# Altium integrated library 兰格封装.IntLib: 1176 symbols (part 5 of 6) (continued)
## RES  氧化膜电阻  10R/1W
designator R?, comment 10R
10R/1W  氧化膜电阻; 物料名称: 10R 1W氧化膜电阻; 物料代码: 3.01.03.02.07.0016; 仓库名称: 元件仓; 助记码: 10R 1WYHMDZ; 单位: ֻ; 加工方式: 插件; 规格型号: *
footprint RS 1W (直插色环电阻，脚距15mm，直径4mm)
pins: 1, 2
2 alternate drawings of the same symbol

## RES  氧化膜电阻  33R/1W
designator R?, comment 33R
33R/1W 氧化膜电阻(无 ); 仓库名称: 元件仓; 单位: ֻ; 加工方式: 插件; 物料名称: *; 物料代码: *; 助记码: *; 规格型号: *
footprint RS 1W (直插色环电阻，脚距15mm，直径4mm)
pins: 1, 2
2 alternate drawings of the same symbol

## RES  氧化膜电阻  47R/1W
designator R?, comment 47R
47R/1W 氧化膜电阻(无 ); 仓库名称: 元件仓; 单位: ֻ; 加工方式: 插件; 物料名称: *; 物料代码: *; 助记码: *; 规格型号: *
footprint RS 1W (直插色环电阻，脚距15mm，直径4mm)
pins: 1, 2
2 alternate drawings of the same symbol

## RES  氧化膜电阻  68R/1W
designator R?, comment 68R
68R/1W 氧化膜电阻(无 ); 仓库名称: 元件仓; 单位: ֻ; 加工方式: 插件; 物料名称: *; 物料代码: *; 助记码: *; 规格型号: *
footprint RS 1W (直插色环电阻，脚距15mm，直径4mm)
pins: 1, 2
2 alternate drawings of the same symbol

## RES  氧化膜电阻  75R/1W
designator R?, comment 75R
75R/1W 氧化膜电阻(无 ); 仓库名称: 元件仓; 单位: ֻ; 加工方式: 插件; 物料名称: *; 物料代码: *; 助记码: *; 规格型号: *
footprint RS 1W (直插色环电阻，脚距15mm，直径4mm)
pins: 1, 2
2 alternate drawings of the same symbol

## RES  氧化膜电阻  100R/1W
designator R?, comment 100R
100R/1W 氧化膜电阻(无 ); 仓库名称: 元件仓; 单位: ֻ; 加工方式: 插件; 物料名称: *; 物料代码: *; 助记码: *; 规格型号: *
footprint RS 1W (直插色环电阻，脚距15mm，直径4mm)
pins: 1, 2
2 alternate drawings of the same symbol

## RES  氧化膜电阻  150R/1W
designator R?, comment 150R
150R/1W 氧化膜电阻; 物料名称: 150R 1W 氧化膜电阻; 物料代码: 3.01.03.02.07.0001; 仓库名称: 元件仓; 助记码: 150R 1W YHDZ; 单位: ֻ; 加工方式: 插件; 规格型号: *
footprint RS 1W (直插色环电阻，脚距15mm，直径4mm)
pins: 1, 2
2 alternate drawings of the same symbol

## RES  氧化膜电阻  220R/1W
designator R?, comment 220R
220R/1W 氧化膜电阻; 物料名称: 220R 1W 氧化膜电阻; 物料代码: 3.01.03.02.07.0004; 仓库名称: 元件仓; 助记码: 220R 1W YHDZ; 单位: ֻ; 加工方式: 插件; 规格型号: *
footprint RS 1W (直插色环电阻，脚距15mm，直径4mm)
pins: 1, 2
2 alternate drawings of the same symbol

## RES  氧化膜电阻  330R/1W
designator R?, comment 330R
330R/1W 氧化膜电阻(无 ); 仓库名称: 元件仓; 单位: ֻ; 加工方式: 插件; 物料名称: *; 物料代码: *; 助记码: *; 规格型号: *
footprint RS 1W (直插色环电阻，脚距15mm，直径4mm)
pins: 1, 2
2 alternate drawings of the same symbol

## RES  氧化膜电阻  470R/1W
designator R?, comment 470R
470R/1W 氧化膜电阻(无 ); 仓库名称: 元件仓; 单位: ֻ; 加工方式: 插件; 物料名称: *; 物料代码: *; 助记码: *; 规格型号: *
footprint RS 1W (直插色环电阻，脚距15mm，直径4mm)
pins: 1, 2
2 alternate drawings of the same symbol

## RES  氧化膜电阻  560R/1W
designator R?, comment 560R
560R/1W 氧化膜电阻(无 ); 仓库名称: 元件仓; 单位: ֻ; 加工方式: 插件; 物料名称: *; 物料代码: *; 助记码: *; 规格型号: *
footprint RS 1W (直插色环电阻，脚距15mm，直径4mm)
pins: 1, 2
2 alternate drawings of the same symbol

## RES  氧化膜电阻  680R/1W
designator R?, comment 680R
680R/1W 氧化膜电阻(无 ); 仓库名称: 元件仓; 单位: ֻ; 加工方式: 插件; 物料名称: *; 物料代码: *; 助记码: *; 规格型号: *
footprint RS 1W (直插色环电阻，脚距15mm，直径4mm)
pins: 1, 2
2 alternate drawings of the same symbol

## RES  氧化膜电阻   750R/1W
designator R?, comment 750R
750R/1W 氧化膜电阻(无 ); 仓库名称: 元件仓; 单位: ֻ; 加工方式: 插件; 物料名称: *; 物料代码: *; 助记码: *; 规格型号: *
footprint RS 1W (直插色环电阻，脚距15mm，直径4mm)
pins: 1, 2
2 alternate drawings of the same symbol

## RES  水泥电阻  10R/5W  卧式
designator R?, comment 10RJ/5W
10R/5W  卧式  水泥电阻; 物料代码: 3.01.03.02.02.0003; 仓库名称: 元件仓; 助记码: 10R/5W  WS  SNDZ; 单位: ֻ; 加工方式: 插件; 物料名称: 10R/5W  卧式  水泥电阻; 规格型号: *
footprint 水泥电阻卧式  5W10RJ
pins: 1, 2
2 alternate drawings of the same symbol

## RES  热敏电阻  10K
designator R?, comment 10K
10K 热敏电阻; 物料代码: 3.01.03.02.04.0001; 仓库名称: 元件仓; 单位: ֻ; 加工方式: 插件; 物料名称: 10K 热敏电阻; 规格型号: *
footprint NTC  10D-20 (热敏电阻)
pins: 1, 2
2 alternate drawings of the same symbol

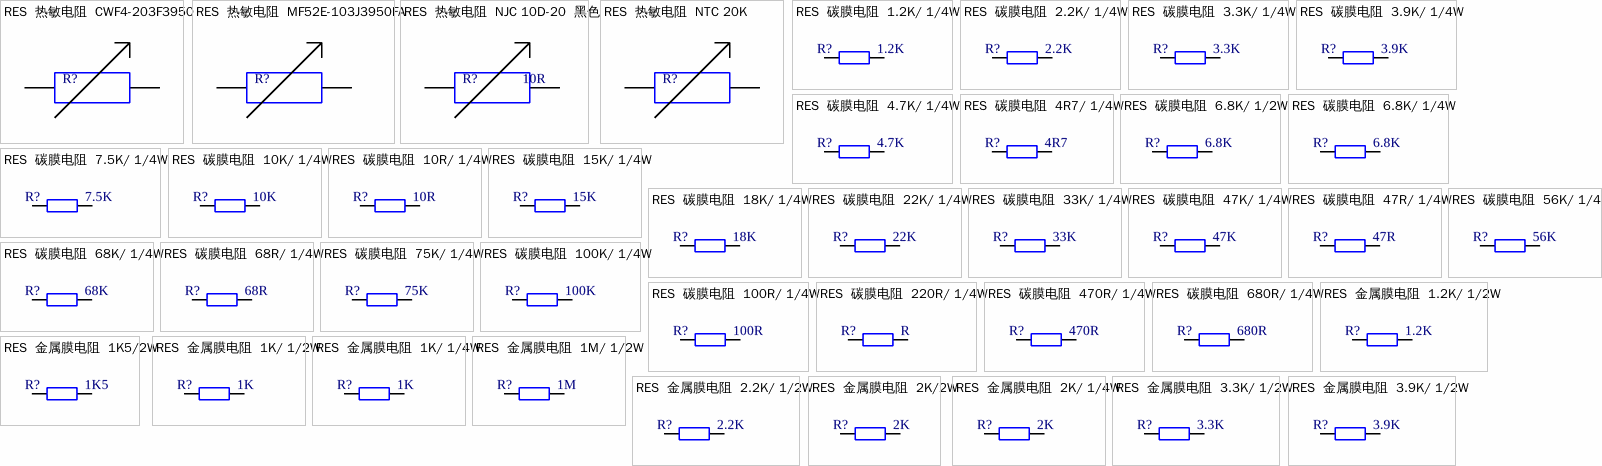
[diagram p43: symbols RES  热敏电阻  CWF4-203F3950 to RES  金属膜电阻  3.9K/ 1/2W]

## RES  热敏电阻  CWF4-203F3950
designator R?
CWF4-203F3950  U型热敏电阻; 物料代码: 3.01.03.02.04.0007; 仓库名称: 元件仓; 助记码: CWF4-203F3950  UXRMD; 单位: ֻ; 加工方式: 插件; 物料名称: CWF4-203F3950  U型热敏电阻; 规格型号: *
footprint NTC  10D-20 (热敏电阻)
pins: 1, 2
2 alternate drawings of the same symbol

## RES  热敏电阻  MF52E-103J3950FA
designator R?
MF52E-103J3950FA 热敏电阻; 物料代码: 3.01.03.02.04.0006; 仓库名称: 元件仓; 助记码: MF52E-103J3950FA RMD; 单位: ֻ; 加工方式: 插件; 物料名称: MF52E-103J3950FA 热敏电阻; 规格型号: *
footprint NTC  10D-20 (热敏电阻)
pins: 1, 2
2 alternate drawings of the same symbol

## RES  热敏电阻  NJC 10D-20  黑色
designator R?, comment 10R
NJC 10D-20黑色热敏电阻; 物料代码: 3.01.03.02.04.0004; 仓库名称: 元件仓; 助记码: NJC 10D-20HSRMDZ; 单位: ֻ; 加工方式: 插件; 物料名称: NJC 10D-20黑色热敏电阻; 规格型号: *
footprint NTC  10D-20 (热敏电阻)
pins: 1, 2
2 alternate drawings of the same symbol

## RES  热敏电阻  NTC 20K
designator R?
NTC 20K 热敏电阻; 物料代码: 3.01.03.02.04.0005; 仓库名称: 元件仓; 助记码: NTC 20K RMDZ; 单位: ֻ; 加工方式: 插件; 物料名称: NTC 20K 热敏电阻; 规格型号: *
footprint NTC  10D-20 (热敏电阻)
pins: 1, 2
2 alternate drawings of the same symbol

## RES  碳膜电阻  1.2K/ 1/4W
designator R?, comment 1.2K
1.2K/ 1/4W 碳膜电阻; 物料名称: 1.2K 1/4W 碳膜电阻; 物料代码: 3.01.03.02.01.0027; 仓库名称: 元件仓; 助记码: 1.2K 1/4W TMDZ; 单位: ֻ; 加工方式: 插件; 规格型号: *
footprint RS 1/4W (直插色环电阻，脚距9mm，直径2.3mm)
pins: 1, 2
2 alternate drawings of the same symbol

## RES  碳膜电阻  2.2K/ 1/4W
designator R?, comment 2.2K
2.2K/ 1/4W 碳膜电阻; 物料名称: 2.2K 1/4W 碳膜电阻; 物料代码: 3.01.03.02.01.0024; 仓库名称: 元件仓; 助记码: 2.2K 1/4W TMDZ; 单位: ֻ; 加工方式: 插件; 规格型号: *
footprint RS 1/4W (直插色环电阻，脚距9mm，直径2.3mm)
pins: 1, 2
2 alternate drawings of the same symbol

## RES  碳膜电阻  3.3K/ 1/4W
designator R?, comment 3.3K
3.3K/ 1/4W 碳膜电阻  （无）; 仓库名称: 元件仓; 单位: ֻ; 加工方式: 插件; 物料名称: *; 物料代码: *; 助记码: *; 规格型号: *
footprint RS 1/4W (直插色环电阻，脚距9mm，直径2.3mm)
pins: 1, 2
2 alternate drawings of the same symbol

## RES  碳膜电阻  3.9K/ 1/4W
designator R?, comment 3.9K
3.9K/ 1/4W 碳膜电阻  （无）; 仓库名称: 元件仓; 单位: ֻ; 加工方式: 插件; 物料名称: *; 物料代码: *; 助记码: *; 规格型号: *
footprint RS 1/4W (直插色环电阻，脚距9mm，直径2.3mm)
pins: 1, 2
2 alternate drawings of the same symbol

## RES  碳膜电阻  4.7K/ 1/4W
designator R?, comment 4.7K
4.7K/ 1/4W 碳膜电阻; 物料名称: 4.7K 1/4W 碳膜电阻; 物料代码: 3.01.03.02.01.0025; 仓库名称: 元件仓; 助记码: 4.7K 1/4W TMDZ; 单位: ֻ; 加工方式: 插件; 规格型号: *
footprint RS 1/4W (直插色环电阻，脚距9mm，直径2.3mm)
pins: 1, 2
2 alternate drawings of the same symbol

## RES  碳膜电阻  4R7/ 1/4W
designator R?, comment 4R7
4R7/ 1/4W  碳膜电阻; 物料名称: 4R7 1/4W碳膜电阻; 物料代码: 3.01.03.02.01.0046; 仓库名称: 元件仓; 助记码: 4R7 1/4WTMDZ; 单位: ֻ; 加工方式: 插件; 规格型号: *
footprint RS 1/4W (直插色环电阻，脚距9mm，直径2.3mm)
pins: 1, 2
2 alternate drawings of the same symbol

## RES  碳膜电阻  6.8K/ 1/2W
designator R?, comment 6.8K
6.8K/ 1/2W 碳膜电阻; 物料名称: 6.8K 1/2W 碳膜电阻; 物料代码: 3.01.03.02.01.0015; 仓库名称: 元件仓; 助记码: 6.8K 1/2 TMDZ; 单位: ֻ; 加工方式: 插件; 规格型号: *
footprint RS 1/2W (直插色环电阻，脚距12.5mm，直径3mm)
pins: 1, 2
2 alternate drawings of the same symbol

## RES  碳膜电阻  6.8K/ 1/4W
designator R?, comment 6.8K
6.8K/ 1/4W 碳膜电阻（无）; 仓库名称: 元件仓; 单位: ֻ; 加工方式: 插件; 规格型号: *
footprint RS 1/2W (直插色环电阻，脚距12.5mm，直径3mm)
pins: 1, 2
2 alternate drawings of the same symbol

## RES  碳膜电阻  7.5K/ 1/4W
designator R?, comment 7.5K
7.5K/ 1/4W 碳膜电阻  （无）; 仓库名称: 元件仓; 单位: ֻ; 加工方式: 插件; 物料名称: *; 物料代码: *; 助记码: *; 规格型号: *
footprint RS 1/4W (直插色环电阻，脚距9mm，直径2.3mm)
pins: 1, 2
2 alternate drawings of the same symbol

## RES  碳膜电阻  10K/ 1/4W
designator R?, comment 10K
10K/ 1/4W 碳膜电阻; 物料名称: 10K 1/4W 碳膜电阻; 物料代码: 3.01.03.02.01.0029; 仓库名称: 元件仓; 助记码: 10K 1/4W TMDZ; 单位: ֻ; 加工方式: 插件; 规格型号: *
footprint RS 1/4W (直插色环电阻，脚距9mm，直径2.3mm)
pins: 1, 2
2 alternate drawings of the same symbol

## RES  碳膜电阻  10R/ 1/4W
designator R?, comment 10R
10R/ 1/4W 碳膜电阻; 物料名称: 10R 1/4W 碳膜电阻; 物料代码: 3.01.03.02.01.0020; 仓库名称: 元件仓; 助记码: 10R 1/4W TMDZ; 单位: ֻ; 加工方式: 插件; 规格型号: *
footprint RS 1/4W (直插色环电阻，脚距9mm，直径2.3mm)
pins: 1, 2
2 alternate drawings of the same symbol

## RES  碳膜电阻  15K/ 1/4W
designator R?, comment 15K
15K/ 1/4W 碳膜电阻; 物料名称: 15K 1/4W 碳膜电阻; 物料代码: 3.01.03.02.01.0028; 仓库名称: 元件仓; 助记码: 15K 1/4W TMDZ; 单位: ֻ; 加工方式: 插件; 规格型号: *
footprint RS 1/4W (直插色环电阻，脚距9mm，直径2.3mm)
pins: 1, 2
2 alternate drawings of the same symbol

## RES  碳膜电阻  18K/ 1/4W
designator R?, comment 18K
18K/ 1/4W 碳膜电阻  (无 ); 仓库名称: 元件仓; 单位: ֻ; 加工方式: 插件; 物料名称: *; 物料代码: *; 助记码: *; 规格型号: *
footprint RS 1/4W (直插色环电阻，脚距9mm，直径2.3mm)
pins: 1, 2
2 alternate drawings of the same symbol

## RES  碳膜电阻  22K/ 1/4W
designator R?, comment 22K
22K/ 1/4W 碳膜电阻; 物料名称: 22K 1/4W 碳膜电阻; 物料代码: 3.01.03.02.01.0030; 仓库名称: 元件仓; 助记码: 22K 1/4W TMDZ; 单位: ֻ; 加工方式: 插件; 规格型号: *
footprint RS 1/4W (直插色环电阻，脚距9mm，直径2.3mm)
pins: 1, 2
2 alternate drawings of the same symbol

## RES  碳膜电阻  33K/ 1/4W
designator R?, comment 33K
33K/ 1/4W 碳膜电阻; 物料名称: 33K 1/4W 碳膜电阻; 物料代码: 3.01.03.02.01.0031; 仓库名称: 元件仓; 助记码: 33K 1/4W TMDZ; 单位: ֻ; 加工方式: 插件; 规格型号: *
footprint RS 1/4W (直插色环电阻，脚距9mm，直径2.3mm)
pins: 1, 2
2 alternate drawings of the same symbol

## RES  碳膜电阻  47K/ 1/4W
designator R?, comment 47K
47K/ 1/4W 碳膜电阻; 物料名称: 47K 1/4W 碳膜电阻; 物料代码: 3.01.03.02.01.0032; 仓库名称: 元件仓; 助记码: 47K 1/4W TMDZ; 单位: ֻ; 加工方式: 插件; 规格型号: *
footprint RS 1/4W (直插色环电阻，脚距9mm，直径2.3mm)
pins: 1, 2
2 alternate drawings of the same symbol

## RES  碳膜电阻  47R/ 1/4W
designator R?, comment 47R
47R/ 1/4W 碳膜电阻（无）; 仓库名称: 元件仓; 加工方式: 插件; 物料名称: *; 物料代码: *; 助记码: *; 单位: *; 备注: *; 规格型号: *
footprint RS 1/4W (直插色环电阻，脚距9mm，直径2.3mm)
pins: 1, 2
2 alternate drawings of the same symbol

## RES  碳膜电阻  56K/ 1/4W
designator R?, comment 56K
56K/ 1/4W 碳膜电阻  (无 ); 仓库名称: 元件仓; 单位: ֻ; 加工方式: 插件; 物料名称: *; 物料代码: *; 助记码: *; 规格型号: *
footprint RS 1/4W (直插色环电阻，脚距9mm，直径2.3mm)
pins: 1, 2
2 alternate drawings of the same symbol

## RES  碳膜电阻  68K/ 1/4W
designator R?, comment 68K
68K/ 1/4W 碳膜电阻  (无 ); 仓库名称: 元件仓; 单位: ֻ; 加工方式: 插件; 物料名称: *; 物料代码: *; 助记码: *; 规格型号: *
footprint RS 1/4W (直插色环电阻，脚距9mm，直径2.3mm)
pins: 1, 2
2 alternate drawings of the same symbol

## RES  碳膜电阻  68R/ 1/4W
designator R?, comment 68R
68R/ 1/4W 碳膜电阻（无）; 仓库名称: 元件仓; 加工方式: 插件; 物料名称: *; 物料代码: *; 助记码: *; 单位: *; 备注: *; 规格型号: *
footprint RS 1/4W (直插色环电阻，脚距9mm，直径2.3mm)
pins: 1, 2
2 alternate drawings of the same symbol

## RES  碳膜电阻  75K/ 1/4W
designator R?, comment 75K
75K/ 1/4W 碳膜电阻  (无 ); 仓库名称: 元件仓; 单位: ֻ; 加工方式: 插件; 物料名称: *; 物料代码: *; 助记码: *; 规格型号: *
footprint RS 1/4W (直插色环电阻，脚距9mm，直径2.3mm)
pins: 1, 2
2 alternate drawings of the same symbol

## RES  碳膜电阻  100K/ 1/4W
designator R?, comment 100K
100K/ 1/4W 碳膜电阻  (无 ); 仓库名称: 元件仓; 单位: ֻ; 加工方式: 插件; 物料名称: *; 物料代码: *; 助记码: *; 规格型号: *
footprint RS 1/4W (直插色环电阻，脚距9mm，直径2.3mm)
pins: 1, 2
2 alternate drawings of the same symbol

## RES  碳膜电阻  100R/ 1/4W
designator R?, comment 100R
100R/ 1/4W 碳膜电阻（无）; 仓库名称: 元件仓; 加工方式: 插件; 物料名称: *; 物料代码: *; 助记码: *; 单位: *; 备注: *; 规格型号: *
footprint RS 1/4W (直插色环电阻，脚距9mm，直径2.3mm)
pins: 1, 2
2 alternate drawings of the same symbol

## RES  碳膜电阻  220R/ 1/4W
designator R?, comment R
220R/ 1/4W 碳膜电阻; 物料名称: 220R  1/4W 碳膜电阻; 物料代码: 3.01.03.02.01.0018; 仓库名称: 元件仓; 助记码: 220R  1/4W TMDZ; 单位: ֻ; 加工方式: 插件; 规格型号: *
footprint RS 1/4W (直插色环电阻，脚距9mm，直径2.3mm)
pins: 1, 2
2 alternate drawings of the same symbol

## RES  碳膜电阻  470R/ 1/4W
designator R?, comment 470R
470R/ 1/4W 碳膜电阻; 物料名称: 470R 1/4W 碳膜电阻; 物料代码: 3.01.03.02.01.0021; 仓库名称: 元件仓; 助记码: 470R 1/4W TMDZ; 单位: ֻ; 加工方式: 插件; 规格型号: *
footprint RS 1/4W (直插色环电阻，脚距9mm，直径2.3mm)
pins: 1, 2
2 alternate drawings of the same symbol

## RES  碳膜电阻  680R/ 1/4W
designator R?, comment 680R
680R/ 1/4W 碳膜电阻; 物料名称: 680R 1/4W碳膜电阻; 物料代码: 3.01.03.02.01.0044; 仓库名称: 元件仓; 助记码: 680R 1/4WTMDZ; 单位: ֻ; 加工方式: 插件; 规格型号: *
footprint RS 1/4W (直插色环电阻，脚距9mm，直径2.3mm)
pins: 1, 2
2 alternate drawings of the same symbol

## RES  金属膜电阻  1.2K/ 1/2W
designator R?, comment 1.2K
1.2K/ 1/2W 金属膜电阻  (无 ); 仓库名称: 元件仓; 单位: ֻ; 加工方式: 插件; 物料名称: *; 物料代码: *; 助记码: *; 规格型号: *
footprint RS 1/2W (直插色环电阻，脚距12.5mm，直径3mm)
pins: 1, 2
2 alternate drawings of the same symbol

## RES  金属膜电阻  1K5/2W
designator R?, comment 1K5
1K5/2W 金属膜电阻  (无 ); 仓库名称: 元件仓; 单位: ֻ; 加工方式: 插件; 物料名称: *; 物料代码: *; 助记码: *; 规格型号: *
footprint RS 2W (直插色环电阻，脚距20mm，直径5mm)
pins: 1, 2
2 alternate drawings of the same symbol

## RES  金属膜电阻  1K/ 1/2W
designator R?, comment 1K
1K/ 1/2W 金属膜电阻  (无 ); 仓库名称: 元件仓; 单位: ֻ; 加工方式: 插件; 物料名称: *; 物料代码: *; 助记码: *; 规格型号: *
footprint RS 1/2W (直插色环电阻，脚距12.5mm，直径3mm)
pins: 1, 2
2 alternate drawings of the same symbol

## RES  金属膜电阻  1K/ 1/4W
designator R?, comment 1K
1K/ 1/4W 金属膜电阻  (无 ); 仓库名称: 元件仓; 单位: ֻ; 加工方式: 插件; 物料名称: *; 物料代码: *; 助记码: *; 规格型号: *
footprint RS 1/4W (直插色环电阻，脚距9mm，直径2.3mm)
pins: 1, 2
2 alternate drawings of the same symbol

## RES  金属膜电阻  1M/ 1/2W
designator R?, comment 1M
1M/ 1/2W 金属膜电阻  (无 ); 仓库名称: 元件仓; 单位: ֻ; 加工方式: 插件; 物料名称: *; 物料代码: *; 助记码: *; 规格型号: *
footprint RS 1/2W (直插色环电阻，脚距12.5mm，直径3mm)
pins: 1, 2
2 alternate drawings of the same symbol

## RES  金属膜电阻  2.2K/ 1/2W
designator R?, comment 2.2K
2.2K/ 1/2W 金属膜电阻  (无 ); 仓库名称: 元件仓; 单位: ֻ; 加工方式: 插件; 物料名称: *; 物料代码: *; 助记码: *; 规格型号: *
footprint RS 1/2W (直插色环电阻，脚距12.5mm，直径3mm)
pins: 1, 2
2 alternate drawings of the same symbol

## RES  金属膜电阻  2K/2W
designator R?, comment 2K
2K/2W 金属膜电阻  (无 ); 仓库名称: 元件仓; 单位: ֻ; 加工方式: 插件; 物料名称: *; 物料代码: *; 助记码: *; 规格型号: *
footprint RS 2W (直插色环电阻，脚距20mm，直径5mm)
pins: 1, 2
2 alternate drawings of the same symbol

## RES  金属膜电阻  2K/ 1/4W
designator R?, comment 2K
2K/ 1/4W 金属膜电阻  (无 ); 仓库名称: 元件仓; 单位: ֻ; 加工方式: 插件; 物料名称: *; 物料代码: *; 助记码: *; 规格型号: *
footprint RS 1/4W (直插色环电阻，脚距9mm，直径2.3mm)
pins: 1, 2
2 alternate drawings of the same symbol

## RES  金属膜电阻  3.3K/ 1/2W
designator R?, comment 3.3K
3.3K/ 1/2W 金属膜电阻  (无 ); 仓库名称: 元件仓; 单位: ֻ; 加工方式: 插件; 物料名称: *; 物料代码: *; 助记码: *; 规格型号: *
footprint RS 1/2W (直插色环电阻，脚距12.5mm，直径3mm)
pins: 1, 2
2 alternate drawings of the same symbol

## RES  金属膜电阻  3.9K/ 1/2W
designator R?, comment 3.9K
3.9K/ 1/2W 金属膜电阻  (无 ); 仓库名称: 元件仓; 单位: ֻ; 加工方式: 插件; 物料名称: *; 物料代码: *; 助记码: *; 规格型号: *
footprint RS 1/2W (直插色环电阻，脚距12.5mm，直径3mm)
pins: 1, 2
2 alternate drawings of the same symbol

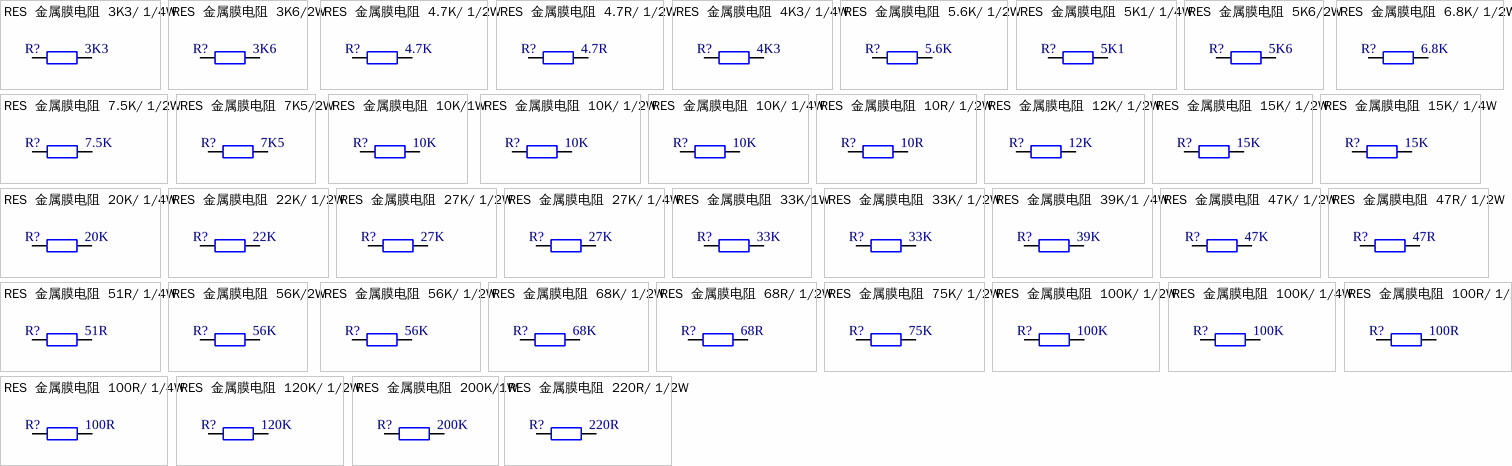
[diagram p44: symbols RES  金属膜电阻  3K3/ 1/4W to RES  金属膜电阻  220R/ 1/2W]

## RES  金属膜电阻  3K3/ 1/4W
designator R?, comment 3K3
3K3/ 1/4W 金属膜电阻  (无 ); 仓库名称: 元件仓; 单位: ֻ; 加工方式: 插件; 物料名称: *; 物料代码: *; 助记码: *; 规格型号: *
footprint RS 1/4W (直插色环电阻，脚距9mm，直径2.3mm)
pins: 1, 2
2 alternate drawings of the same symbol

## RES  金属膜电阻  3K6/2W
designator R?, comment 3K6
3K6/2W 金属膜电阻  (无 ); 仓库名称: 元件仓; 单位: ֻ; 加工方式: 插件; 物料名称: *; 物料代码: *; 助记码: *; 规格型号: *
footprint RS 2W (直插色环电阻，脚距20mm，直径5mm)
pins: 1, 2
2 alternate drawings of the same symbol

## RES  金属膜电阻  4.7K/ 1/2W
designator R?, comment 4.7K
4.7K/ 1/2W 金属膜电阻  (无 ); 仓库名称: 元件仓; 单位: ֻ; 加工方式: 插件; 物料名称: *; 物料代码: *; 助记码: *; 规格型号: *
footprint RS 1/2W (直插色环电阻，脚距12.5mm，直径3mm)
pins: 1, 2
2 alternate drawings of the same symbol

## RES  金属膜电阻  4.7R/ 1/2W
designator R?, comment 4.7R
4.7R/ 1/2W 金属膜电阻  (无 ); 仓库名称: 元件仓; 单位: ֻ; 加工方式: 插件; 物料名称: *; 物料代码: *; 助记码: *; 规格型号: *
footprint RS 1/2W (直插色环电阻，脚距12.5mm，直径3mm)
pins: 1, 2
2 alternate drawings of the same symbol

## RES  金属膜电阻  4K3/ 1/4W
designator R?, comment 4K3
4K3/ 1/4W 金属膜电阻  (无 ); 仓库名称: 元件仓; 单位: ֻ; 加工方式: 插件; 物料名称: *; 物料代码: *; 助记码: *; 规格型号: *
footprint RS 1/4W (直插色环电阻，脚距9mm，直径2.3mm)
pins: 1, 2
2 alternate drawings of the same symbol

## RES  金属膜电阻  5.6K/ 1/2W
designator R?, comment 5.6K
5.6K/ 1/2W 金属膜电阻  (无 ); 仓库名称: 元件仓; 单位: ֻ; 加工方式: 插件; 物料名称: *; 物料代码: *; 助记码: *; 规格型号: *
footprint RS 1/2W (直插色环电阻，脚距12.5mm，直径3mm)
pins: 1, 2
2 alternate drawings of the same symbol

## RES  金属膜电阻  5K1/ 1/4W
designator R?, comment 5K1
5K1/ 1/4W 金属膜电阻  (无 ); 仓库名称: 元件仓; 单位: ֻ; 加工方式: 插件; 物料名称: *; 物料代码: *; 助记码: *; 规格型号: *
footprint RS 1/4W (直插色环电阻，脚距9mm，直径2.3mm)
pins: 1, 2
2 alternate drawings of the same symbol

## RES  金属膜电阻  5K6/2W
designator R?, comment 5K6
5K6/2W 金属膜电阻  (无 ); 仓库名称: 元件仓; 单位: ֻ; 加工方式: 插件; 物料名称: *; 物料代码: *; 助记码: *; 规格型号: *
footprint RS 2W (直插色环电阻，脚距20mm，直径5mm)
pins: 1, 2
2 alternate drawings of the same symbol

## RES  金属膜电阻  6.8K/ 1/2W
designator R?, comment 6.8K
6.8K/ 1/2W 金属膜电阻  (无 ); 仓库名称: 元件仓; 单位: ֻ; 加工方式: 插件; 物料名称: *; 物料代码: *; 助记码: *; 规格型号: *
footprint RS 1/2W (直插色环电阻，脚距12.5mm，直径3mm)
pins: 1, 2
2 alternate drawings of the same symbol

## RES  金属膜电阻  7.5K/ 1/2W
designator R?, comment 7.5K
7.5K/ 1/2W 金属膜电阻  (无 ); 仓库名称: 元件仓; 单位: ֻ; 加工方式: 插件; 物料名称: *; 物料代码: *; 助记码: *; 规格型号: *
footprint RS 1/2W (直插色环电阻，脚距12.5mm，直径3mm)
pins: 1, 2
2 alternate drawings of the same symbol

## RES  金属膜电阻  7K5/2W
designator R?, comment 7K5
7K5/2W 金属膜电阻  (无 ); 仓库名称: 元件仓; 单位: ֻ; 加工方式: 插件; 物料名称: *; 物料代码: *; 助记码: *; 规格型号: *
footprint RS 2W (直插色环电阻，脚距20mm，直径5mm)
pins: 1, 2
2 alternate drawings of the same symbol

## RES  金属膜电阻  10K/1W
designator R?, comment 10K
10K/1W 金属膜电阻  (无 ); 仓库名称: 元件仓; 单位: ֻ; 加工方式: 插件; 物料名称: *; 物料代码: *; 助记码: *; 规格型号: *
footprint RS 1W (直插色环电阻，脚距15mm，直径4mm)
pins: 1, 2
2 alternate drawings of the same symbol

## RES  金属膜电阻  10K/ 1/2W
designator R?, comment 10K
10K/ 1/2W 金属膜电阻  (无 ); 仓库名称: 元件仓; 单位: ֻ; 加工方式: 插件; 物料名称: *; 物料代码: *; 助记码: *; 规格型号: *
footprint RS 1/2W (直插色环电阻，脚距12.5mm，直径3mm)
pins: 1, 2
2 alternate drawings of the same symbol

## RES  金属膜电阻  10K/ 1/4W
designator R?, comment 10K
10K/ 1/4W 金属膜电阻  (无 ); 仓库名称: 元件仓; 单位: ֻ; 加工方式: 插件; 物料名称: *; 物料代码: *; 助记码: *; 规格型号: *
footprint RS 1/4W (直插色环电阻，脚距9mm，直径2.3mm)
pins: 1, 2
2 alternate drawings of the same symbol

## RES  金属膜电阻  10R/ 1/2W
designator R?, comment 10R
10R/ 1/2W 金属膜电阻  (无 ); 仓库名称: 元件仓; 单位: ֻ; 加工方式: 插件; 物料名称: *; 物料代码: *; 助记码: *; 规格型号: *
footprint RS 1/2W (直插色环电阻，脚距12.5mm，直径3mm)
pins: 1, 2
2 alternate drawings of the same symbol

## RES  金属膜电阻  12K/ 1/2W
designator R?, comment 12K
12K/ 1/2W 金属膜电阻  (无 ); 仓库名称: 元件仓; 单位: ֻ; 加工方式: 插件; 物料名称: *; 物料代码: *; 助记码: *; 规格型号: *
footprint RS 1/2W (直插色环电阻，脚距12.5mm，直径3mm)
pins: 1, 2
2 alternate drawings of the same symbol

## RES  金属膜电阻  15K/ 1/2W
designator R?, comment 15K
15K/ 1/2W 金属膜电阻  (无 ); 仓库名称: 元件仓; 单位: ֻ; 加工方式: 插件; 物料名称: *; 物料代码: *; 助记码: *; 规格型号: *
footprint RS 1/2W (直插色环电阻，脚距12.5mm，直径3mm)
pins: 1, 2
2 alternate drawings of the same symbol

## RES  金属膜电阻  15K/ 1/4W
designator R?, comment 15K
15K/ 1/4W 金属膜电阻  (无 ); 仓库名称: 元件仓; 单位: ֻ; 加工方式: 插件; 物料名称: *; 物料代码: *; 助记码: *; 规格型号: *
footprint RS 1/4W (直插色环电阻，脚距9mm，直径2.3mm)
pins: 1, 2
2 alternate drawings of the same symbol

## RES  金属膜电阻  20K/ 1/4W
designator R?, comment 20K
20K/ 1/4W 金属膜电阻  (无 ); 仓库名称: 元件仓; 单位: ֻ; 加工方式: 插件; 物料名称: *; 物料代码: *; 助记码: *; 规格型号: *
footprint RS 1/4W (直插色环电阻，脚距9mm，直径2.3mm)
pins: 1, 2
2 alternate drawings of the same symbol

## RES  金属膜电阻  22K/ 1/2W
designator R?, comment 22K
22K/ 1/2W 金属膜电阻  (无 ); 仓库名称: 元件仓; 单位: ֻ; 加工方式: 插件; 物料名称: *; 物料代码: *; 助记码: *; 规格型号: *
footprint RS 1/2W (直插色环电阻，脚距12.5mm，直径3mm)
pins: 1, 2
2 alternate drawings of the same symbol

## RES  金属膜电阻  27K/ 1/2W
designator R?, comment 27K
27K/ 1/2W 金属膜电阻  (无 ); 仓库名称: 元件仓; 单位: ֻ; 加工方式: 插件; 物料名称: *; 物料代码: *; 助记码: *; 规格型号: *
footprint RS 1/2W (直插色环电阻，脚距12.5mm，直径3mm)
pins: 1, 2
2 alternate drawings of the same symbol

## RES  金属膜电阻  27K/ 1/4W
designator R?, comment 27K
27K/ 1/4W 金属膜电阻  (无 ); 仓库名称: 元件仓; 单位: ֻ; 加工方式: 插件; 物料名称: *; 物料代码: *; 助记码: *; 规格型号: *
footprint RS 1/4W (直插色环电阻，脚距9mm，直径2.3mm)
pins: 1, 2
2 alternate drawings of the same symbol

## RES  金属膜电阻  33K/1W
designator R?, comment 33K
33K/1W 金属膜电阻  (无 ); 仓库名称: 元件仓; 单位: ֻ; 加工方式: 插件; 物料名称: *; 物料代码: *; 助记码: *; 规格型号: *
footprint RS 1W (直插色环电阻，脚距15mm，直径4mm)
pins: 1, 2
2 alternate drawings of the same symbol

## RES  金属膜电阻  33K/ 1/2W
designator R?, comment 33K
33K/ 1/2W 金属膜电阻  (无 ); 仓库名称: 元件仓; 单位: ֻ; 加工方式: 插件; 物料名称: *; 物料代码: *; 助记码: *; 规格型号: *
footprint RS 1/2W (直插色环电阻，脚距12.5mm，直径3mm)
pins: 1, 2
2 alternate drawings of the same symbol

## RES  金属膜电阻  39K/1 /4W
designator R?, comment 39K
39K/1 /4W 金属膜电阻  (无 ); 仓库名称: 元件仓; 单位: ֻ; 加工方式: 插件; 物料名称: *; 物料代码: *; 助记码: *; 规格型号: *
footprint RS 1/4W (直插色环电阻，脚距9mm，直径2.3mm)
pins: 1, 2
2 alternate drawings of the same symbol

## RES  金属膜电阻  47K/ 1/2W
designator R?, comment 47K
47K/ 1/2W 金属膜电阻  (无 ); 仓库名称: 元件仓; 单位: ֻ; 加工方式: 插件; 物料名称: *; 物料代码: *; 助记码: *; 规格型号: *
footprint RS 1/2W (直插色环电阻，脚距12.5mm，直径3mm)
pins: 1, 2
2 alternate drawings of the same symbol

## RES  金属膜电阻  47R/ 1/2W
designator R?, comment 47R
47R/ 1/2W 金属膜电阻  (无 ); 仓库名称: 元件仓; 单位: ֻ; 加工方式: 插件; 物料名称: *; 物料代码: *; 助记码: *; 规格型号: *
footprint RS 1/2W (直插色环电阻，脚距12.5mm，直径3mm)
pins: 1, 2
2 alternate drawings of the same symbol

## RES  金属膜电阻  51R/ 1/4W
designator R?, comment 51R
51R/ 1/4W 金属膜电阻  (无 ); 仓库名称: 元件仓; 单位: ֻ; 加工方式: 插件; 物料名称: *; 物料代码: *; 助记码: *; 规格型号: *
footprint RS 1/4W (直插色环电阻，脚距9mm，直径2.3mm)
pins: 1, 2
2 alternate drawings of the same symbol

## RES  金属膜电阻  56K/2W
designator R?, comment 56K
56K/2W 金属膜电阻  (无 ); 仓库名称: 元件仓; 单位: ֻ; 加工方式: 插件; 物料名称: *; 物料代码: *; 助记码: *; 规格型号: *
footprint RS 2W (直插色环电阻，脚距20mm，直径5mm)
pins: 1, 2
2 alternate drawings of the same symbol

## RES  金属膜电阻  56K/ 1/2W
designator R?, comment 56K
56K/ 1/2W 金属膜电阻  (无 ); 仓库名称: 元件仓; 单位: ֻ; 加工方式: 插件; 物料名称: *; 物料代码: *; 助记码: *; 规格型号: *
footprint RS 1/2W (直插色环电阻，脚距12.5mm，直径3mm)
pins: 1, 2
2 alternate drawings of the same symbol

## RES  金属膜电阻  68K/ 1/2W
designator R?, comment 68K
68K/ 1/2W 金属膜电阻  (无 ); 仓库名称: 元件仓; 单位: ֻ; 加工方式: 插件; 物料名称: *; 物料代码: *; 助记码: *; 规格型号: *
footprint RS 1/2W (直插色环电阻，脚距12.5mm，直径3mm)
pins: 1, 2
2 alternate drawings of the same symbol

## RES  金属膜电阻  68R/ 1/2W
designator R?, comment 68R
68R/ 1/2W 金属膜电阻  (无 ); 仓库名称: 元件仓; 单位: ֻ; 加工方式: 插件; 物料名称: *; 物料代码: *; 助记码: *; 规格型号: *
footprint RS 1/2W (直插色环电阻，脚距12.5mm，直径3mm)
pins: 1, 2
2 alternate drawings of the same symbol

## RES  金属膜电阻  75K/ 1/2W
designator R?, comment 75K
75K/ 1/2W 金属膜电阻  (无 ); 仓库名称: 元件仓; 单位: ֻ; 加工方式: 插件; 物料名称: *; 物料代码: *; 助记码: *; 规格型号: *
footprint RS 1/2W (直插色环电阻，脚距12.5mm，直径3mm)
pins: 1, 2
2 alternate drawings of the same symbol

## RES  金属膜电阻  100K/ 1/2W
designator R?, comment 100K
100K/ 1/2W 金属膜电阻  (无 ); 仓库名称: 元件仓; 单位: ֻ; 加工方式: 插件; 物料名称: *; 物料代码: *; 助记码: *; 规格型号: *
footprint RS 1/2W (直插色环电阻，脚距12.5mm，直径3mm)
pins: 1, 2
2 alternate drawings of the same symbol

## RES  金属膜电阻  100K/ 1/4W
designator R?, comment 100K
100K/ 1/4W 金属膜电阻  (无 ); 仓库名称: 元件仓; 单位: ֻ; 加工方式: 插件; 物料名称: *; 物料代码: *; 助记码: *; 规格型号: *
footprint RS 1/4W (直插色环电阻，脚距9mm，直径2.3mm)
pins: 1, 2
2 alternate drawings of the same symbol

## RES  金属膜电阻  100R/ 1/2W
designator R?, comment 100R
100R/ 1/2W 金属膜电阻  (无 ); 仓库名称: 元件仓; 单位: ֻ; 加工方式: 插件; 物料名称: *; 物料代码: *; 助记码: *; 规格型号: *
footprint RS 1/2W (直插色环电阻，脚距12.5mm，直径3mm)
pins: 1, 2
2 alternate drawings of the same symbol

## RES  金属膜电阻  100R/ 1/4W
designator R?, comment 100R
100R/ 1/4W 金属膜电阻  (无 ); 仓库名称: 元件仓; 单位: ֻ; 加工方式: 插件; 物料名称: *; 物料代码: *; 助记码: *; 规格型号: *
footprint RS 1/4W (直插色环电阻，脚距9mm，直径2.3mm)
pins: 1, 2
2 alternate drawings of the same symbol

## RES  金属膜电阻  120K/ 1/2W
designator R?, comment 120K
120K/ 1/2W 金属膜电阻  (无 ); 仓库名称: 元件仓; 单位: ֻ; 加工方式: 插件; 物料名称: *; 物料代码: *; 助记码: *; 规格型号: *
footprint RS 1/2W (直插色环电阻，脚距12.5mm，直径3mm)
pins: 1, 2
2 alternate drawings of the same symbol

## RES  金属膜电阻  200K/1W
designator R?, comment 200K
200K/1W 金属膜电阻  (无 ); 仓库名称: 元件仓; 单位: ֻ; 加工方式: 插件; 物料名称: *; 物料代码: *; 助记码: *; 规格型号: *
footprint RS 1W (直插色环电阻，脚距15mm，直径4mm)
pins: 1, 2
2 alternate drawings of the same symbol

## RES  金属膜电阻  220R/ 1/2W
designator R?, comment 220R
220R/ 1/2W 金属膜电阻  (无 ); 仓库名称: 元件仓; 单位: ֻ; 加工方式: 插件; 物料名称: *; 物料代码: *; 助记码: *; 规格型号: *
footprint RS 1/2W (直插色环电阻，脚距12.5mm，直径3mm)
pins: 1, 2
2 alternate drawings of the same symbol

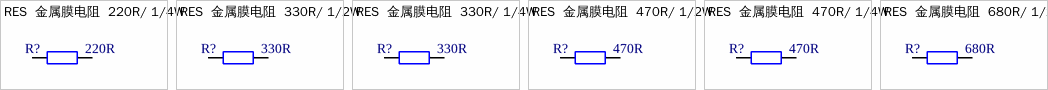
[diagram p45: symbols RES  金属膜电阻  220R/ 1/4W to RES  金属膜电阻  680R/ 1/2W]

## RES  金属膜电阻  220R/ 1/4W
designator R?, comment 220R
220R/ 1/4W 金属膜电阻  (无 ); 仓库名称: 元件仓; 单位: ֻ; 加工方式: 插件; 物料名称: *; 物料代码: *; 助记码: *; 规格型号: *
footprint RS 1/4W (直插色环电阻，脚距9mm，直径2.3mm)
pins: 1, 2
2 alternate drawings of the same symbol

## RES  金属膜电阻  330R/ 1/2W
designator R?, comment 330R
330R/ 1/2W 金属膜电阻  (无 ); 仓库名称: 元件仓; 单位: ֻ; 加工方式: 插件; 物料名称: *; 物料代码: *; 助记码: *; 规格型号: *
footprint RS 1/2W (直插色环电阻，脚距12.5mm，直径3mm)
pins: 1, 2
2 alternate drawings of the same symbol

## RES  金属膜电阻  330R/ 1/4W
designator R?, comment 330R
330R/ 1/4W 金属膜电阻  (无 ); 仓库名称: 元件仓; 单位: ֻ; 加工方式: 插件; 物料名称: *; 物料代码: *; 助记码: *; 规格型号: *
footprint RS 1/4W (直插色环电阻，脚距9mm，直径2.3mm)
pins: 1, 2
2 alternate drawings of the same symbol

## RES  金属膜电阻  470R/ 1/2W
designator R?, comment 470R
470R/ 1/2W 金属膜电阻  (无 ); 仓库名称: 元件仓; 单位: ֻ; 加工方式: 插件; 物料名称: *; 物料代码: *; 助记码: *; 规格型号: *
footprint RS 1/2W (直插色环电阻，脚距12.5mm，直径3mm)
pins: 1, 2
2 alternate drawings of the same symbol

## RES  金属膜电阻  470R/ 1/4W
designator R?, comment 470R
470R/ 1/4W 金属膜电阻  (无 ); 仓库名称: 元件仓; 单位: ֻ; 加工方式: 插件; 物料名称: *; 物料代码: *; 助记码: *; 规格型号: *
footprint RS 1/4W (直插色环电阻，脚距9mm，直径2.3mm)
pins: 1, 2
2 alternate drawings of the same symbol

## RES  金属膜电阻  680R/ 1/2W
designator R?, comment 680R
680R/ 1/2W 金属膜电阻  (无 ); 仓库名称: 元件仓; 单位: ֻ; 加工方式: 插件; 物料名称: *; 物料代码: *; 助记码: *; 规格型号: *
footprint RS 1/2W (直插色环电阻，脚距12.5mm，直径3mm)
pins: 1, 2
2 alternate drawings of the same symbol


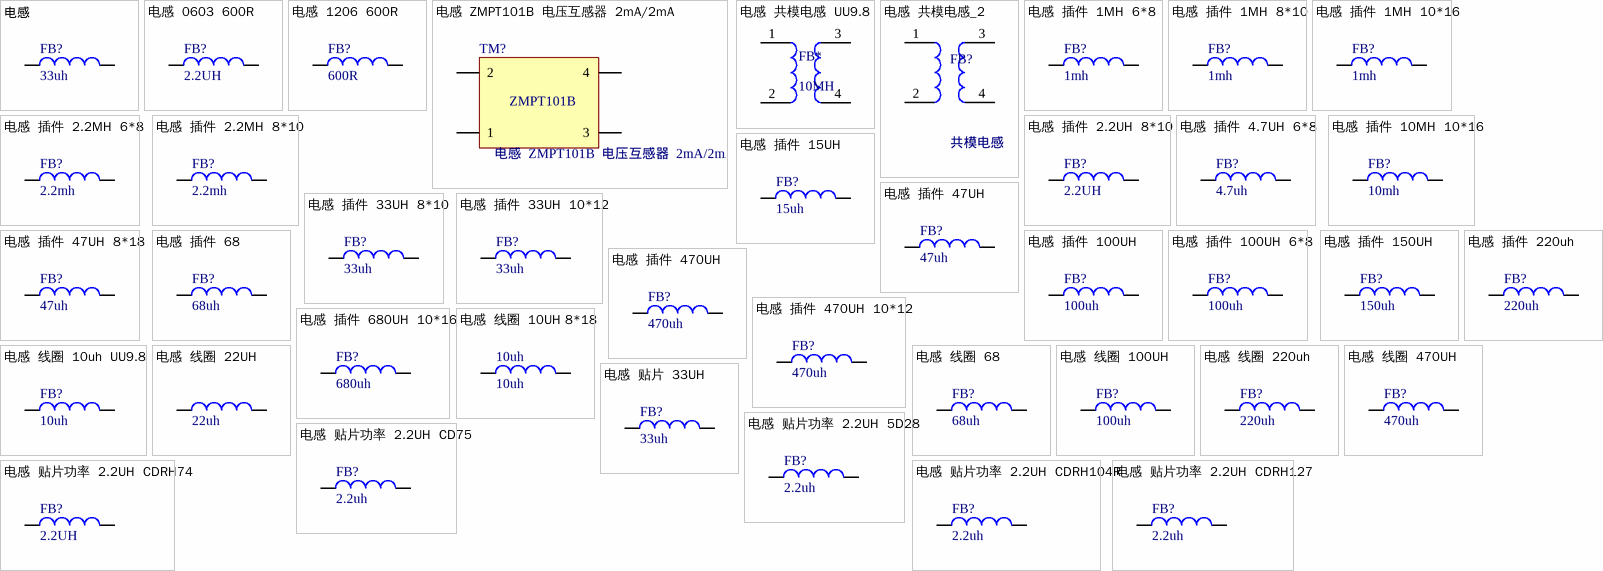
[diagram p46: symbols 电感 to 电感  贴片功率  2.2UH  CDRH127]

## 电感
designator FB?, comment 33uh
环形电感; 加工方式: 插件; Revision: July-2002: Re-released for DXP Platform.; 物料代码: *; 物料名称: *; 规格型号: *; 助记码: *; 单位: *; 备注: *; 仓库名称: *
footprint 电感　8*18　环型
pins: 1, 2

## 电感  0603  600R
designator FB?, comment 2.2UH
0603 600R瓷珠电感; 加工方式: 贴片; 物料代码: 3.01.09.02.04.0001; 仓库名称: 元件仓; 单位: ֻ; 物料名称: 0603 600R瓷珠电感; 备注: *; 助记码: *; 规格型号: *
footprint L0603
pins: 1, 2

## 电感  1206  600R
designator FB?, comment 600R
1206 600R瓷珠电感; 加工方式: 贴片; 物料代码: 3.01.09.02.04.0002; 仓库名称: 元件仓; 单位: ֻ; 物料名称: 1206 600R瓷珠电感; 备注: *; 助记码: *; 规格型号: *
footprint L1206
pins: 1, 2

## 电感  ZMPT101B  电压互感器  2mA/2mA
designator TM?
ZMPT101B 2mA/2mA  电压互感器; 物料代码: 3.02.01.02.0010; 助记码: ZMPT101B 2mA/2mA  DY; 规格型号: 蓝色; 仓库名称: 五金仓; 单位: 个; 加工方式: 插件; 物料名称: ZMPT101B 2mA/2mA  电压互感器; 备注: *
footprint ZMPT101B 互感器 (隔离电压互感器)
pins: 1, 2, 3, 4
text: ZMPT101B

## 电感  共模电感  UU9.8
designator FB*, comment 10MH
UU9.8共模电感; 加工方式: 插件; 物料代码: 3.01.09.01.04.0004; 助记码: 0.27线径10MH; 规格型号: UU9.8GMDG; 单位: ֻ; 仓库名称: 元件仓; 物料名称: UU9.8共模电感; 备注: *
footprint UU9.8 (17*12*17mm(长宽高）)
pins: 1, 2, 3, 4

## 电感  共模电感_2
designator FB?, comment 共模电感
单位: 个; 仓库名称: 五金仓; 加工方式: 插件; 物料代码: *; 物料名称: *; 助记码: *; 规格型号: *; 备注: *
footprint 共模电感2 (电感4P   20*32*34.5)
pins: 1, 2, 3, 4

## 电感  插件  1MH  6*8
designator FB?, comment 1mh
1MH插件电感; 加工方式: 插件; 物料名称: *; 物料代码: *; 备注: *; 助记码: *; 单位: *; 规格型号: *
footprint 电感直插6 x8
pins: 1, 2

## 电感  插件  1MH  8*10
designator FB?, comment 1mh
1MH插件电感; 加工方式: 插件; 物料名称: *; 物料代码: *; 备注: *; 助记码: *; 单位: *; 规格型号: *
footprint 电感直插 8 x10
pins: 1, 2

## 电感  插件  1MH  10*16
designator FB?, comment 1mh
1MH插件电感; 加工方式: 插件; 物料名称: *; 物料代码: *; 备注: *; 助记码: *; 单位: *; 规格型号: *
footprint 电感直插 10 x16
pins: 1, 2

## 电感  插件  2.2MH  6*8
designator FB?, comment 2.2mh
2.2MH插件电感; 加工方式: 插件; 物料名称: *; 物料代码: *; 备注: *; 助记码: *; 单位: *; 规格型号: *
footprint 电感直插6 x8
pins: 1, 2

## 电感  插件  2.2MH  8*10
designator FB?, comment 2.2mh
2.2MH插件电感; 加工方式: 插件; 物料名称: *; 物料代码: *; 备注: *; 助记码: *; 单位: *; 规格型号: *
footprint 电感直插 8 x10
pins: 1, 2

## 电感  插件  2.2UH  8*10
designator FB?, comment 2.2UH
2.2UH插件电感; 加工方式: 插件; 物料名称: *; 物料代码: *; 备注: *; 助记码: *; 单位: *; 规格型号: *
footprint 电感直插 8 x10
pins: 1, 2

## 电感  插件  4.7UH  6*8
designator FB?, comment 4.7uh
4.7UH插件电感; 加工方式: 插件; 仓库名称: 五金仓; 物料名称: *; 物料代码: *; 备注: *; 助记码: *; 单位: *; 规格型号: *
footprint 电感直插6 x8
pins: 1, 2

## 电感  插件  10MH  10*16
designator FB?, comment 10mh
10MH插件电感; 加工方式: 插件; 物料名称: *; 物料代码: *; 备注: *; 助记码: *; 单位: *; 规格型号: *
footprint 电感直插 10 x16
pins: 1, 2

## 电感  插件  15UH
designator FB?, comment 15uh
15UH插件电感; 加工方式: 插件; 物料名称: *; 物料代码: *; 备注: *; 助记码: *; 单位: *; 规格型号: *
footprint PK0912 (6*10*14mm(脚距，直径，高）)
pins: 1, 2

## 电感  插件  33UH  8*10
designator FB?, comment 33uh
33UH插件电感; 加工方式: 插件; 物料名称: *; 物料代码: *; 备注: *; 助记码: *; 单位: *; 规格型号: *
footprint 电感直插 8 x10
pins: 1, 2

## 电感  插件  33UH  10*12
designator FB?, comment 33uh
33UH插件电感; 加工方式: 插件; 物料名称: *; 物料代码: *; 备注: *; 助记码: *; 单位: *; 规格型号: *
footprint 电感直插 10 x12
pins: 1, 2

## 电感  插件  47UH
designator FB?, comment 47uh
47UH插件电感; 加工方式: 插件; 物料名称: *; 物料代码: *; 备注: *; 助记码: *; 单位: *; 规格型号: *
footprint PK0912 (6*10*14mm(脚距，直径，高）)
pins: 1, 2

## 电感  插件  47UH  8*18
designator FB?, comment 47uh
47UH插件电感0810; 加工方式: 插件; 物料名称: *; 物料代码: *; 备注: *; 助记码: *; 单位: *; 规格型号: *
footprint 电感　8*18　环型
pins: 1, 2

## 电感  插件  68
designator FB?, comment 68uh
68插件电感; 加工方式: 插件; 物料名称: *; 物料代码: *; 备注: *; 助记码: *; 单位: *; 规格型号: *
footprint PK0912 (6*10*14mm(脚距，直径，高）)
pins: 1, 2

## 电感  插件  100UH
designator FB?, comment 100uh
插件电感; 加工方式: 插件; 物料名称: *; 物料代码: *; 备注: *; 助记码: *; 单位: *; 规格型号: *
footprint PK0912 (6*10*14mm(脚距，直径，高）)
pins: 1, 2

## 电感  插件  100UH  6*8
designator FB?, comment 100uh
100UH插件电感; 加工方式: 插件; 物料名称: *; 物料代码: *; 备注: *; 助记码: *; 单位: *; 规格型号: *
footprint 电感直插6 x8
pins: 1, 2

## 电感  插件  150UH
designator FB?, comment 150uh
150UH插件电感; 加工方式: 插件; 物料名称: *; 物料代码: *; 备注: *; 助记码: *; 单位: *; 规格型号: *
footprint 电感直插 10 x16
pins: 1, 2

## 电感  插件  220uh
designator FB?, comment 220uh
220uh插件电感; 物料名称: *; 物料代码: *; 备注: *; 助记码: *; 单位: *; 规格型号: *
footprint 电感直插6 x8
pins: 1, 2

## 电感  插件  470UH
designator FB?, comment 470uh
470UH插件电感; 加工方式: 插件; 物料名称: *; 物料代码: *; 备注: *; 助记码: *; 单位: *; 规格型号: *
footprint 电感直插6 x8
pins: 1, 2

## 电感  插件  470UH  10*12
designator FB?, comment 470uh
470UH插件电感; 加工方式: 插件; 物料名称: *; 物料代码: *; 备注: *; 助记码: *; 单位: *; 规格型号: *
footprint 电感直插 10 x12
pins: 1, 2

## 电感  插件  680UH  10*16
designator FB?, comment 680uh
680UH插件电感; 加工方式: 插件; 物料名称: *; 物料代码: *; 备注: *; 助记码: *; 单位: *; 规格型号: *
footprint 电感直插 10 x16
pins: 1, 2

## 电感  线圈  10UH 8*18
designator 10uh, comment 10uh
10uh线圈电感; 物料名称: *; 物料代码: *; 备注: *; 助记码: *; 单位: *; 规格型号: *
footprint 电感　8*18　环型
pins: 1, 2

## 电感  线圈  10uh  UU9.8
designator FB?, comment 10uh
10uh线圈电感; 物料名称: *; 物料代码: *; 备注: *; 助记码: *; 单位: *; 规格型号: *
footprint UU9.8 (17*12*17mm(长宽高）)
pins: 1, 2

## 电感  线圈  22UH
designator ?, comment 22uh
22UH线圈电感; 物料名称: *; 物料代码: *; 备注: *; 助记码: *; 单位: *; 规格型号: *
pins: 1, 2

## 电感  线圈  68
designator FB?, comment 68uh
68线圈电感; 物料名称: *; 物料代码: *; 备注: *; 助记码: *; 单位: *; 规格型号: *
pins: 1, 2

## 电感  线圈  100UH
designator FB?, comment 100uh
100UH线圈电感; 物料名称: *; 物料代码: *; 备注: *; 助记码: *; 单位: *; 规格型号: *
pins: 1, 2

## 电感  线圈  220uh
designator FB?, comment 220uh
220uh线圈电感; 物料名称: *; 物料代码: *; 备注: *; 助记码: *; 单位: *; 规格型号: *
pins: 1, 2

## 电感  线圈  470UH
designator FB?, comment 470uh
470UH线圈电感; 物料名称: *; 物料代码: *; 备注: *; 助记码: *; 单位: *; 规格型号: *
pins: 1, 2

## 电感  贴片  33UH
designator FB?, comment 33uh
33UH贴片电感; 物料名称: *; 物料代码: *; 备注: *; 助记码: *; 单位: *; 规格型号: *
pins: 1, 2

## 电感  贴片功率  2.2UH  5D28
designator FB?, comment 2.2uh
5D28-2.2UH 贴片功率电感; 加工方式: 贴片; 物料代码: 3.01.09.02.03.0009; 仓库名称: 元件仓; 助记码: 5D28-2.2UH TPGLDG; 单位: ֻ; 规格型号: 带屏蔽; 物料名称: 5D28-2.2UH 贴片功率电感
footprint CDRH 5D28
pins: 1, 2

## 电感  贴片功率  2.2UH  CD75
designator FB?, comment 2.2uh
CD75-2.2UH贴片功率电感（无）; 加工方式: 贴片; 仓库名称: 元件仓; 单位: ֻ; 物料名称: *; 物料代码: *; 备注: *; 助记码: *; 规格型号: *
footprint CD 75
pins: 1, 2

## 电感  贴片功率  2.2UH  CDRH74
designator FB?, comment 2.2UH
RH74-2.2UH 贴片功率电感; 加工方式: 贴片; 物料代码: 3.01.09.02.03.0001; 仓库名称: 元件仓; 助记码: RH74-2.2UH TPGLDG; 单位: ֻ; 规格型号: 带屏蔽; 物料名称: RH74-2.2UH 贴片功率电感
footprint CDRH74 (7.3*7.3*4.5mm（长宽高）)
pins: 1, 2

## 电感  贴片功率  2.2UH  CDRH104R
designator FB?, comment 2.2uh
RH104-2.2UH 贴片功率电感; 加工方式: 贴片; 物料代码: 3.01.09.02.03.0012; 仓库名称: 元件仓; 助记码: RH104-2.2UH TPGLDG; 单位: ֻ; 规格型号: 带屏蔽; 物料名称: RH104-2.2UH 贴片功率电感
footprint CDRH 104R
pins: 1, 2